# Altium schematic symbol library jlcpcb_2025_04_capacitors_extended_0402.schlib: 3594 symbols (part 17 of 20) (continued)
## JMK105BJ225MVHF
designator C?  Capacitance: 2.2uF  (hidden comment: *)
Capacitor, Ceramic (MLCC), 2.2uF, ±20%, 6.3V, X5R, ±20%, SMD 0402; Manufacturer: Taiyo Yuden; Manufacturer Part Number: JMK105BJ225MVHF; Package Size: 0402; JLCPCB Basic Part: No; JLCPCB Part Number: C386010; Supplier 1: LCSC; Category: Capacitors - MLCC; Supplier Part Number 1: C386010; Tolerance: ±20%; Voltage Rating: 6.3V; Temperature Coefficient: X5R; RoHS: Yes; ComponentLink1Description: Datasheet; ComponentLink1URL: https://wmsc.lcsc.com/wmsc/upload/file/pdf/v2/lcsc/1912111437_Taiyo-Yuden-JMK105BJ225MVHF_C386010.pdf; ComponentLink2Description: JLCPCB Part URL; ComponentLink2URL: https://jlcpcb.com/partdetail/C386010; ComponentLink3Description: LCSC Part URL; ComponentLink3URL: https://lcsc.com/product-detail/Multilayer-Ceramic-Capacitors-MLCC---SMD-SMT_Taiyo-Yuden-Taiyo-Yuden-JMK105BJ225MVHF_C386010.html
footprint CAP-0402 (0402 (1005M) Capacitor)
pins: 1, 2

## JMK105BJ474KV-F
designator C?  Capacitance: 470nF  (hidden comment: *)
Capacitor, Ceramic (MLCC), 470nF, ±10%, 6.3V, X5R, ±10%, SMD 0402; Manufacturer: Taiyo Yuden; Manufacturer Part Number: JMK105BJ474KV-F; Package Size: 0402; JLCPCB Basic Part: No; JLCPCB Part Number: C386011; Supplier 1: LCSC; Category: Capacitors - MLCC; Supplier Part Number 1: C386011; Tolerance: ±10%; Voltage Rating: 6.3V; Temperature Coefficient: X5R; RoHS: Yes; ComponentLink1Description: Datasheet; ComponentLink1URL: https://wmsc.lcsc.com/wmsc/upload/file/pdf/v2/lcsc/2211282230_Taiyo-Yuden-JMK105BJ474KV-F_C386011.pdf; ComponentLink2Description: JLCPCB Part URL; ComponentLink2URL: https://jlcpcb.com/partdetail/C386011; ComponentLink3Description: LCSC Part URL; ComponentLink3URL: https://lcsc.com/product-detail/Multilayer-Ceramic-Capacitors-MLCC---SMD-SMT_Taiyo-Yuden-Taiyo-Yuden-JMK105BJ474KV-F_C386011.html
footprint CAP-0402 (0402 (1005M) Capacitor)
pins: 1, 2

## JMK105C6105KV-F
designator C?  Capacitance: 1uF  (hidden comment: *)
Capacitor, Ceramic (MLCC), 1uF, ±10%, 6.3V, X6S, ±10%, SMD 0402; Manufacturer: Taiyo Yuden; Manufacturer Part Number: JMK105C6105KV-F; Package Size: 0402; JLCPCB Basic Part: No; JLCPCB Part Number: C386013; Supplier 1: LCSC; Category: Capacitors - MLCC; Supplier Part Number 1: C386013; Tolerance: ±10%; Voltage Rating: 6.3V; Temperature Coefficient: X6S; RoHS: Yes; ComponentLink1Description: Datasheet; ComponentLink1URL: https://wmsc.lcsc.com/wmsc/upload/file/pdf/v2/lcsc/2211282230_Taiyo-Yuden-JMK105C6105KV-F_C386013.pdf; ComponentLink2Description: JLCPCB Part URL; ComponentLink2URL: https://jlcpcb.com/partdetail/C386013; ComponentLink3Description: LCSC Part URL; ComponentLink3URL: https://lcsc.com/product-detail/Multilayer-Ceramic-Capacitors-MLCC---SMD-SMT_Taiyo-Yuden-Taiyo-Yuden-JMK105C6105KV-F_C386013.html
footprint CAP-0402 (0402 (1005M) Capacitor)
pins: 1, 2

## JMK105C6105KVLF
designator C?  Capacitance: 1uF  (hidden comment: *)
Capacitor, Ceramic (MLCC), 1uF, ±10%, 6.3V, X6S, ±10%, SMD 0402; Manufacturer: Taiyo Yuden; Manufacturer Part Number: JMK105C6105KVLF; Package Size: 0402; JLCPCB Basic Part: No; JLCPCB Part Number: C348736; Supplier 1: LCSC; Category: Capacitors - MLCC; Supplier Part Number 1: C348736; Tolerance: ±10%; Voltage Rating: 6.3V; Temperature Coefficient: X6S; RoHS: Yes; ComponentLink1Description: Datasheet; ComponentLink1URL: https://wmsc.lcsc.com/wmsc/upload/file/pdf/v2/lcsc/2304140030_Taiyo-Yuden-JMK105C6105KVLF_C348736.pdf; ComponentLink2Description: JLCPCB Part URL; ComponentLink2URL: https://jlcpcb.com/partdetail/C348736; ComponentLink3Description: LCSC Part URL; ComponentLink3URL: https://lcsc.com/product-detail/Multilayer-Ceramic-Capacitors-MLCC---SMD-SMT_Taiyo-Yuden-Taiyo-Yuden-JMK105C6105KVLF_C348736.html
footprint CAP-0402 (0402 (1005M) Capacitor)
pins: 1, 2

## JMK105C6225KV-F
designator C?  Capacitance: 2.2uF  (hidden comment: *)
Capacitor, Ceramic (MLCC), 2.2uF, ±10%, 6.3V, X6S, ±10%, SMD 0402; Manufacturer: Taiyo Yuden; Manufacturer Part Number: JMK105C6225KV-F; Package Size: 0402; JLCPCB Basic Part: No; JLCPCB Part Number: C1870803; Supplier 1: LCSC; Category: Capacitors - MLCC; Supplier Part Number 1: C1870803; Tolerance: ±10%; Voltage Rating: 6.3V; Temperature Coefficient: X6S; RoHS: Yes; ComponentLink1Description: Datasheet; ComponentLink1URL: https://wmsc.lcsc.com/wmsc/upload/file/pdf/v2/lcsc/2108160930_Taiyo-Yuden-JMK105C6225KV-F_C1870803.pdf; ComponentLink2Description: JLCPCB Part URL; ComponentLink2URL: https://jlcpcb.com/partdetail/C1870803; ComponentLink3Description: LCSC Part URL; ComponentLink3URL: https://lcsc.com/product-detail/Multilayer-Ceramic-Capacitors-MLCC---SMD-SMT_Taiyo-Yuden-Taiyo-Yuden-JMK105C6225KV-F_C1870803.html
footprint CAP-0402 (0402 (1005M) Capacitor)
pins: 1, 2

## JMK105CBJ106MV-F
designator C?  Capacitance: 10uF  (hidden comment: *)
Capacitor, Ceramic (MLCC), 10uF, ±20%, 6.3V, X5R, ±20%, SMD 0402; Manufacturer: Taiyo Yuden; Manufacturer Part Number: JMK105CBJ106MV-F; Package Size: 0402; JLCPCB Basic Part: No; JLCPCB Part Number: C87148; Supplier 1: LCSC; Category: Capacitors - MLCC; Supplier Part Number 1: C87148; Tolerance: ±20%; Voltage Rating: 6.3V; Temperature Coefficient: X5R; RoHS: Yes; ComponentLink1Description: Datasheet; ComponentLink1URL: https://wmsc.lcsc.com/wmsc/upload/file/pdf/v2/lcsc/2304140030_Taiyo-Yuden-JMK105CBJ106MV-F_C87148.pdf; ComponentLink2Description: JLCPCB Part URL; ComponentLink2URL: https://jlcpcb.com/partdetail/C87148; ComponentLink3Description: LCSC Part URL; ComponentLink3URL: https://lcsc.com/product-detail/Multilayer-Ceramic-Capacitors-MLCC---SMD-SMT_Taiyo-Yuden-Taiyo-Yuden-JMK105CBJ106MV-F_C87148.html
footprint CAP-0402 (0402 (1005M) Capacitor)
pins: 1, 2

## JMK105CD7105KVHF
designator C?  Capacitance: 1uF  (hidden comment: *)
Capacitor, Ceramic (MLCC), 1uF, ±20%, 6.3V, ±20%, SMD 0402; Manufacturer: Taiyo Yuden; Manufacturer Part Number: JMK105CD7105KVHF; Package Size: 0402; JLCPCB Basic Part: No; JLCPCB Part Number: C2766074; Supplier 1: LCSC; Category: Capacitors - MLCC; Supplier Part Number 1: C2766074; Tolerance: ±20%; Voltage Rating: 6.3V; RoHS: Yes; ComponentLink1Description: Datasheet; ComponentLink1URL: https://wmsc.lcsc.com/wmsc/upload/file/pdf/v2/lcsc/2106061634_Taiyo-Yuden-JMK105CD7105KVHF_C2766074.pdf; ComponentLink2Description: JLCPCB Part URL; ComponentLink2URL: https://jlcpcb.com/partdetail/C2766074; ComponentLink3Description: LCSC Part URL; ComponentLink3URL: https://lcsc.com/product-detail/Multilayer-Ceramic-Capacitors-MLCC---SMD-SMT_Taiyo-Yuden-Taiyo-Yuden-JMK105CD7105KVHF_C2766074.html
footprint CAP-0402 (0402 (1005M) Capacitor)
pins: 1, 2

## LDK105CBJ106MVLF
designator C?  Capacitance: 10uF  (hidden comment: *)
Capacitor, Ceramic (MLCC), 10uF, ±20%, 10V, X5R, ±20%, SMD 0402; Manufacturer: Taiyo Yuden; Manufacturer Part Number: LDK105CBJ106MVLF; Package Size: 0402; JLCPCB Basic Part: No; JLCPCB Part Number: C386033; Supplier 1: LCSC; Category: Capacitors - MLCC; Supplier Part Number 1: C386033; Tolerance: ±20%; Voltage Rating: 10V; Temperature Coefficient: X5R; RoHS: Yes; ComponentLink1Description: Datasheet; ComponentLink1URL: https://wmsc.lcsc.com/wmsc/upload/file/pdf/v2/lcsc/1912111437_Taiyo-Yuden-LDK105CBJ106MVLF_C386033.pdf; ComponentLink2Description: JLCPCB Part URL; ComponentLink2URL: https://jlcpcb.com/partdetail/C386033; ComponentLink3Description: LCSC Part URL; ComponentLink3URL: https://lcsc.com/product-detail/Multilayer-Ceramic-Capacitors-MLCC---SMD-SMT_Taiyo-Yuden-Taiyo-Yuden-LDK105CBJ106MVLF_C386033.html
footprint CAP-0402 (0402 (1005M) Capacitor)
pins: 1, 2

## LLD153D80G105ME01D
designator C?  Capacitance: 1uF  (hidden comment: *)
Capacitor, Ceramic (MLCC), 1uF, ±20%, 4V, X6T, ±20%, SMD 0402; Manufacturer: Murata Electronics; Manufacturer Part Number: LLD153D80G105ME01D; Package Size: 0402; JLCPCB Basic Part: No; JLCPCB Part Number: C435415; Supplier 1: LCSC; Category: Capacitors - MLCC; Supplier Part Number 1: C435415; Tolerance: ±20%; Voltage Rating: 4V; Temperature Coefficient: X6T; RoHS: Yes; ComponentLink1Description: Datasheet; ComponentLink1URL: https://wmsc.lcsc.com/wmsc/upload/file/pdf/v2/lcsc/2004100909_Murata-Electronics-LLD153D80G105ME01D_C435415.pdf; ComponentLink2Description: JLCPCB Part URL; ComponentLink2URL: https://jlcpcb.com/partdetail/C435415; ComponentLink3Description: LCSC Part URL; ComponentLink3URL: https://lcsc.com/product-detail/Multilayer-Ceramic-Capacitors-MLCC---SMD-SMT_Murata-Electronics-Murata-Electronics-LLD153D80G105ME01D_C435415.html
footprint CAP-0402 (0402 (1005M) Capacitor)
pins: 1, 2

## LMK105ABJ225KVHF
designator C?  Capacitance: 2.2uF  (hidden comment: *)
Capacitor, Ceramic (MLCC), 2.2uF, ±10%, 10V, X5R, ±10%, SMD 0402; Manufacturer: Taiyo Yuden; Manufacturer Part Number: LMK105ABJ225KVHF; Package Size: 0402; JLCPCB Basic Part: No; JLCPCB Part Number: C386040; Supplier 1: LCSC; Category: Capacitors - MLCC; Supplier Part Number 1: C386040; Tolerance: ±10%; Voltage Rating: 10V; Temperature Coefficient: X5R; RoHS: Yes; ComponentLink1Description: Datasheet; ComponentLink1URL: https://wmsc.lcsc.com/wmsc/upload/file/pdf/v2/lcsc/1912111437_Taiyo-Yuden-LMK105ABJ225KVHF_C386040.pdf; ComponentLink2Description: JLCPCB Part URL; ComponentLink2URL: https://jlcpcb.com/partdetail/C386040; ComponentLink3Description: LCSC Part URL; ComponentLink3URL: https://lcsc.com/product-detail/Multilayer-Ceramic-Capacitors-MLCC---SMD-SMT_Taiyo-Yuden-Taiyo-Yuden-LMK105ABJ225KVHF_C386040.html
footprint CAP-0402 (0402 (1005M) Capacitor)
pins: 1, 2

## LMK105ABJ225MVHF
designator C?  Capacitance: 2.2uF  (hidden comment: *)
Capacitor, Ceramic (MLCC), 2.2uF, ±20%, 10V, X5R, ±20%, SMD 0402; Manufacturer: Taiyo Yuden; Manufacturer Part Number: LMK105ABJ225MVHF; Package Size: 0402; JLCPCB Basic Part: No; JLCPCB Part Number: C386041; Supplier 1: LCSC; Category: Capacitors - MLCC; Supplier Part Number 1: C386041; Tolerance: ±20%; Voltage Rating: 10V; Temperature Coefficient: X5R; RoHS: Yes; ComponentLink1Description: Datasheet; ComponentLink1URL: https://wmsc.lcsc.com/wmsc/upload/file/pdf/v2/lcsc/2211282230_Taiyo-Yuden-LMK105ABJ225MVHF_C386041.pdf; ComponentLink2Description: JLCPCB Part URL; ComponentLink2URL: https://jlcpcb.com/partdetail/C386041; ComponentLink3Description: LCSC Part URL; ComponentLink3URL: https://lcsc.com/product-detail/Multilayer-Ceramic-Capacitors-MLCC---SMD-SMT_Taiyo-Yuden-Taiyo-Yuden-LMK105ABJ225MVHF_C386041.html
footprint CAP-0402 (0402 (1005M) Capacitor)
pins: 1, 2

## LMK105B7224KVHF
designator C?  Capacitance: 220nF  (hidden comment: *)
Capacitor, Ceramic (MLCC), 220nF, ±10%, 10V, X7R, ±10%, SMD 0402; Manufacturer: Taiyo Yuden; Manufacturer Part Number: LMK105B7224KVHF; Package Size: 0402; JLCPCB Basic Part: No; JLCPCB Part Number: C386042; Supplier 1: LCSC; Category: Capacitors - MLCC; Supplier Part Number 1: C386042; Tolerance: ±10%; Voltage Rating: 10V; Temperature Coefficient: X7R; RoHS: Yes; ComponentLink1Description: Datasheet; ComponentLink1URL: https://wmsc.lcsc.com/wmsc/upload/file/pdf/v2/lcsc/2211282230_Taiyo-Yuden-LMK105B7224KVHF_C386042.pdf; ComponentLink2Description: JLCPCB Part URL; ComponentLink2URL: https://jlcpcb.com/partdetail/C386042; ComponentLink3Description: LCSC Part URL; ComponentLink3URL: https://lcsc.com/product-detail/Multilayer-Ceramic-Capacitors-MLCC---SMD-SMT_Taiyo-Yuden-Taiyo-Yuden-LMK105B7224KVHF_C386042.html
footprint CAP-0402 (0402 (1005M) Capacitor)
pins: 1, 2

## LMK105BBJ475KV-F
designator C?  Capacitance: 4.7uF  (hidden comment: *)
Capacitor, Ceramic (MLCC), 4.7uF, ±10%, 10V, X5R, ±10%, SMD 0402; Manufacturer: Taiyo Yuden; Manufacturer Part Number: LMK105BBJ475KV-F; Package Size: 0402; JLCPCB Basic Part: No; JLCPCB Part Number: C2986065; Supplier 1: LCSC; Category: Capacitors - MLCC; Supplier Part Number 1: C2986065; Tolerance: ±10%; Voltage Rating: 10V; Temperature Coefficient: X5R; RoHS: Yes; ComponentLink1Description: Datasheet; ComponentLink1URL: https://wmsc.lcsc.com/wmsc/upload/file/pdf/v2/lcsc/2203281730_Taiyo-Yuden-LMK105BBJ475KV-F_C2986065.pdf; ComponentLink2Description: JLCPCB Part URL; ComponentLink2URL: https://jlcpcb.com/partdetail/C2986065; ComponentLink3Description: LCSC Part URL; ComponentLink3URL: https://lcsc.com/product-detail/Multilayer-Ceramic-Capacitors-MLCC---SMD-SMT_Taiyo-Yuden-Taiyo-Yuden-LMK105BBJ475KV-F_C2986065.html
footprint CAP-0402 (0402 (1005M) Capacitor)
pins: 1, 2

## LMK105BBJ475MVLF
designator C?  Capacitance: 4.7uF  (hidden comment: *)
Capacitor, Ceramic (MLCC), 4.7uF, ±20%, 10V, X5R, ±20%, SMD 0402; Manufacturer: Taiyo Yuden; Manufacturer Part Number: LMK105BBJ475MVLF; Package Size: 0402; JLCPCB Basic Part: No; JLCPCB Part Number: C386043; Supplier 1: LCSC; Category: Capacitors - MLCC; Supplier Part Number 1: C386043; Tolerance: ±20%; Voltage Rating: 10V; Temperature Coefficient: X5R; RoHS: Yes; ComponentLink1Description: Datasheet; ComponentLink1URL: https://wmsc.lcsc.com/wmsc/upload/file/pdf/v2/lcsc/2211282230_Taiyo-Yuden-LMK105BBJ475MVLF_C386043.pdf; ComponentLink2Description: JLCPCB Part URL; ComponentLink2URL: https://jlcpcb.com/partdetail/C386043; ComponentLink3Description: LCSC Part URL; ComponentLink3URL: https://lcsc.com/product-detail/Multilayer-Ceramic-Capacitors-MLCC---SMD-SMT_Taiyo-Yuden-Taiyo-Yuden-LMK105BBJ475MVLF_C386043.html
footprint CAP-0402 (0402 (1005M) Capacitor)
pins: 1, 2

## LMK105BJ104KVHF
designator C?  Capacitance: 100nF  (hidden comment: *)
Capacitor, Ceramic (MLCC), 100nF, ±10%, 10V, X5R, ±10%, SMD 0402; Manufacturer: Taiyo Yuden; Manufacturer Part Number: LMK105BJ104KVHF; Package Size: 0402; JLCPCB Basic Part: No; JLCPCB Part Number: C386044; Supplier 1: LCSC; Category: Capacitors - MLCC; Supplier Part Number 1: C386044; Tolerance: ±10%; Voltage Rating: 10V; Temperature Coefficient: X5R; RoHS: Yes; ComponentLink1Description: Datasheet; ComponentLink1URL: https://wmsc.lcsc.com/wmsc/upload/file/pdf/v2/lcsc/1912111437_Taiyo-Yuden-LMK105BJ104KVHF_C386044.pdf; ComponentLink2Description: JLCPCB Part URL; ComponentLink2URL: https://jlcpcb.com/partdetail/C386044; ComponentLink3Description: LCSC Part URL; ComponentLink3URL: https://lcsc.com/product-detail/Multilayer-Ceramic-Capacitors-MLCC---SMD-SMT_Taiyo-Yuden-Taiyo-Yuden-LMK105BJ104KVHF_C386044.html
footprint CAP-0402 (0402 (1005M) Capacitor)
pins: 1, 2

## LMK105BJ105KV-F
designator C?  Capacitance: 1uF  (hidden comment: *)
Capacitor, Ceramic (MLCC), 1uF, ±10%, 10V, X5R, ±10%, SMD 0402; Manufacturer: Taiyo Yuden; Manufacturer Part Number: LMK105BJ105KV-F; Package Size: 0402; JLCPCB Basic Part: No; JLCPCB Part Number: C87145; Supplier 1: LCSC; Category: Capacitors - MLCC; Supplier Part Number 1: C87145; Tolerance: ±10%; Voltage Rating: 10V; Temperature Coefficient: X5R; RoHS: Yes; ComponentLink1Description: Datasheet; ComponentLink1URL: https://wmsc.lcsc.com/wmsc/upload/file/pdf/v2/lcsc/2304140030_Taiyo-Yuden-LMK105BJ105KV-F_C87145.pdf; ComponentLink2Description: JLCPCB Part URL; ComponentLink2URL: https://jlcpcb.com/partdetail/C87145; ComponentLink3Description: LCSC Part URL; ComponentLink3URL: https://lcsc.com/product-detail/Multilayer-Ceramic-Capacitors-MLCC---SMD-SMT_Taiyo-Yuden-Taiyo-Yuden-LMK105BJ105KV-F_C87145.html
footprint CAP-0402 (0402 (1005M) Capacitor)
pins: 1, 2

## LMK105BJ105KVBF
designator C?  Capacitance: 1uF  (hidden comment: *)
Capacitor, Ceramic (MLCC), 1uF, ±10%, 10V, X5R, ±10%, SMD 0402; Manufacturer: Taiyo Yuden; Manufacturer Part Number: LMK105BJ105KVBF; Package Size: 0402; JLCPCB Basic Part: No; JLCPCB Part Number: C337448; Supplier 1: LCSC; Category: Capacitors - MLCC; Supplier Part Number 1: C337448; Tolerance: ±10%; Voltage Rating: 10V; Temperature Coefficient: X5R; RoHS: Yes; ComponentLink1Description: Datasheet; ComponentLink1URL: https://wmsc.lcsc.com/wmsc/upload/file/pdf/v2/lcsc/2304140030_Taiyo-Yuden-LMK105BJ105KVBF_C337448.pdf; ComponentLink2Description: JLCPCB Part URL; ComponentLink2URL: https://jlcpcb.com/partdetail/C337448; ComponentLink3Description: LCSC Part URL; ComponentLink3URL: https://lcsc.com/product-detail/Multilayer-Ceramic-Capacitors-MLCC---SMD-SMT_Taiyo-Yuden-Taiyo-Yuden-LMK105BJ105KVBF_C337448.html
footprint CAP-0402 (0402 (1005M) Capacitor)
pins: 1, 2

## LMK105BJ105KVHF
designator C?  Capacitance: 1uF  (hidden comment: *)
Capacitor, Ceramic (MLCC), 1uF, ±10%, 10V, X5R, ±10%, SMD 0402; Manufacturer: Taiyo Yuden; Manufacturer Part Number: LMK105BJ105KVHF; Package Size: 0402; JLCPCB Basic Part: No; JLCPCB Part Number: C412453; Supplier 1: LCSC; Category: Capacitors - MLCC; Supplier Part Number 1: C412453; Tolerance: ±10%; Voltage Rating: 10V; Temperature Coefficient: X5R; RoHS: Yes; ComponentLink1Description: Datasheet; ComponentLink1URL: https://wmsc.lcsc.com/wmsc/upload/file/pdf/v2/lcsc/2304140030_Taiyo-Yuden-LMK105BJ105KVHF_C412453.pdf; ComponentLink2Description: JLCPCB Part URL; ComponentLink2URL: https://jlcpcb.com/partdetail/C412453; ComponentLink3Description: LCSC Part URL; ComponentLink3URL: https://lcsc.com/product-detail/Multilayer-Ceramic-Capacitors-MLCC---SMD-SMT_Taiyo-Yuden-Taiyo-Yuden-LMK105BJ105KVHF_C412453.html
footprint CAP-0402 (0402 (1005M) Capacitor)
pins: 1, 2

## LMK105BJ224KV-F
designator C?  Capacitance: 220nF  (hidden comment: *)
Capacitor, Ceramic (MLCC), 220nF, ±10%, 10V, X5R, ±10%, SMD 0402; Manufacturer: Taiyo Yuden; Manufacturer Part Number: LMK105BJ224KV-F; Package Size: 0402; JLCPCB Basic Part: No; JLCPCB Part Number: C89141; Supplier 1: LCSC; Category: Capacitors - MLCC; Supplier Part Number 1: C89141; Tolerance: ±10%; Voltage Rating: 10V; Temperature Coefficient: X5R; RoHS: Yes; ComponentLink1Description: Datasheet; ComponentLink1URL: https://wmsc.lcsc.com/wmsc/upload/file/pdf/v2/lcsc/2304140030_Taiyo-Yuden-LMK105BJ224KV-F_C89141.pdf; ComponentLink2Description: JLCPCB Part URL; ComponentLink2URL: https://jlcpcb.com/partdetail/C89141; ComponentLink3Description: LCSC Part URL; ComponentLink3URL: https://lcsc.com/product-detail/Multilayer-Ceramic-Capacitors-MLCC---SMD-SMT_Taiyo-Yuden-Taiyo-Yuden-LMK105BJ224KV-F_C89141.html
footprint CAP-0402 (0402 (1005M) Capacitor)
pins: 1, 2

## LMK105BJ225KV-F
designator C?  Capacitance: 2.2uF  (hidden comment: *)
Capacitor, Ceramic (MLCC), 2.2uF, ±10%, 10V, X5R, ±10%, SMD 0402; Manufacturer: Taiyo Yuden; Manufacturer Part Number: LMK105BJ225KV-F; Package Size: 0402; JLCPCB Basic Part: No; JLCPCB Part Number: C319191; Supplier 1: LCSC; Category: Capacitors - MLCC; Supplier Part Number 1: C319191; Tolerance: ±10%; Voltage Rating: 10V; Temperature Coefficient: X5R; RoHS: Yes; ComponentLink1Description: Datasheet; ComponentLink1URL: https://wmsc.lcsc.com/wmsc/upload/file/pdf/v2/lcsc/2304140030_Taiyo-Yuden-LMK105BJ225KV-F_C319191.pdf; ComponentLink2Description: JLCPCB Part URL; ComponentLink2URL: https://jlcpcb.com/partdetail/C319191; ComponentLink3Description: LCSC Part URL; ComponentLink3URL: https://lcsc.com/product-detail/Multilayer-Ceramic-Capacitors-MLCC---SMD-SMT_Taiyo-Yuden-Taiyo-Yuden-LMK105BJ225KV-F_C319191.html
footprint CAP-0402 (0402 (1005M) Capacitor)
pins: 1, 2

## LMK105BJ225MV-F
designator C?  Capacitance: 2.2uF  (hidden comment: *)
Capacitor, Ceramic (MLCC), 2.2uF, ±20%, 10V, X5R, ±20%, SMD 0402; Manufacturer: Taiyo Yuden; Manufacturer Part Number: LMK105BJ225MV-F; Package Size: 0402; JLCPCB Basic Part: No; JLCPCB Part Number: C92805; Supplier 1: LCSC; Category: Capacitors - MLCC; Supplier Part Number 1: C92805; Tolerance: ±20%; Voltage Rating: 10V; Temperature Coefficient: X5R; RoHS: Yes; ComponentLink1Description: Datasheet; ComponentLink1URL: https://wmsc.lcsc.com/wmsc/upload/file/pdf/v2/lcsc/2211282300_Taiyo-Yuden-LMK105BJ225MV-F_C92805.pdf; ComponentLink2Description: JLCPCB Part URL; ComponentLink2URL: https://jlcpcb.com/partdetail/C92805; ComponentLink3Description: LCSC Part URL; ComponentLink3URL: https://lcsc.com/product-detail/Multilayer-Ceramic-Capacitors-MLCC---SMD-SMT_Taiyo-Yuden-Taiyo-Yuden-LMK105BJ225MV-F_C92805.html
footprint CAP-0402 (0402 (1005M) Capacitor)
pins: 1, 2

## LMK105BJ473KV-F
designator C?  Capacitance: 47nF  (hidden comment: *)
Capacitor, Ceramic (MLCC), 47nF, ±10%, 10V, X5R, ±10%, SMD 0402; Manufacturer: Taiyo Yuden; Manufacturer Part Number: LMK105BJ473KV-F; Package Size: 0402; JLCPCB Basic Part: No; JLCPCB Part Number: C386045; Supplier 1: LCSC; Category: Capacitors - MLCC; Supplier Part Number 1: C386045; Tolerance: ±10%; Voltage Rating: 10V; Temperature Coefficient: X5R; RoHS: Yes; ComponentLink1Description: Datasheet; ComponentLink1URL: https://wmsc.lcsc.com/wmsc/upload/file/pdf/v2/lcsc/2304140030_Taiyo-Yuden-LMK105BJ473KV-F_C386045.pdf; ComponentLink2Description: JLCPCB Part URL; ComponentLink2URL: https://jlcpcb.com/partdetail/C386045; ComponentLink3Description: LCSC Part URL; ComponentLink3URL: https://lcsc.com/product-detail/Multilayer-Ceramic-Capacitors-MLCC---SMD-SMT_Taiyo-Yuden-Taiyo-Yuden-LMK105BJ473KV-F_C386045.html
footprint CAP-0402 (0402 (1005M) Capacitor)
pins: 1, 2

## LMK105BJ474KV-F
designator C?  Capacitance: 470nF  (hidden comment: *)
Capacitor, Ceramic (MLCC), 470nF, ±10%, 10V, X5R, ±10%, SMD 0402; Manufacturer: Taiyo Yuden; Manufacturer Part Number: LMK105BJ474KV-F; Package Size: 0402; JLCPCB Basic Part: No; JLCPCB Part Number: C89142; Supplier 1: LCSC; Category: Capacitors - MLCC; Supplier Part Number 1: C89142; Tolerance: ±10%; Voltage Rating: 10V; Temperature Coefficient: X5R; RoHS: Yes; ComponentLink1Description: Datasheet; ComponentLink1URL: https://wmsc.lcsc.com/wmsc/upload/file/pdf/v2/lcsc/2211282300_Taiyo-Yuden-LMK105BJ474KV-F_C89142.pdf; ComponentLink2Description: JLCPCB Part URL; ComponentLink2URL: https://jlcpcb.com/partdetail/C89142; ComponentLink3Description: LCSC Part URL; ComponentLink3URL: https://lcsc.com/product-detail/Multilayer-Ceramic-Capacitors-MLCC---SMD-SMT_Taiyo-Yuden-Taiyo-Yuden-LMK105BJ474KV-F_C89142.html
footprint CAP-0402 (0402 (1005M) Capacitor)
pins: 1, 2

## LMK105C6105KV-F
designator C?  Capacitance: 1uF  (hidden comment: *)
Capacitor, Ceramic (MLCC), 1uF, ±10%, 10V, X6S, ±10%, SMD 0402; Manufacturer: Taiyo Yuden; Manufacturer Part Number: LMK105C6105KV-F; Package Size: 0402; JLCPCB Basic Part: No; JLCPCB Part Number: C386046; Supplier 1: LCSC; Category: Capacitors - MLCC; Supplier Part Number 1: C386046; Tolerance: ±10%; Voltage Rating: 10V; Temperature Coefficient: X6S; RoHS: Yes; ComponentLink1Description: Datasheet; ComponentLink1URL: https://wmsc.lcsc.com/wmsc/upload/file/pdf/v2/lcsc/2211282230_Taiyo-Yuden-LMK105C6105KV-F_C386046.pdf; ComponentLink2Description: JLCPCB Part URL; ComponentLink2URL: https://jlcpcb.com/partdetail/C386046; ComponentLink3Description: LCSC Part URL; ComponentLink3URL: https://lcsc.com/product-detail/Multilayer-Ceramic-Capacitors-MLCC---SMD-SMT_Taiyo-Yuden-Taiyo-Yuden-LMK105C6105KV-F_C386046.html
footprint CAP-0402 (0402 (1005M) Capacitor)
pins: 1, 2

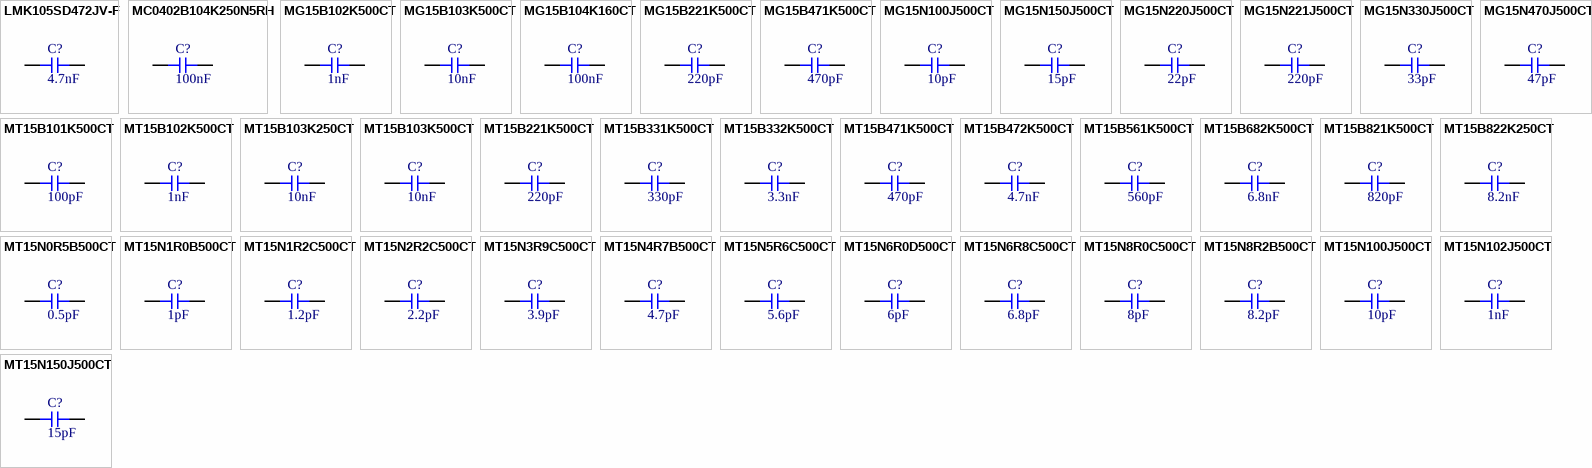
[diagram p78: symbols LMK105SD472JV-F to MT15N150J500CT]

## LMK105SD472JV-F
designator C?  Capacitance: 4.7nF  (hidden comment: *)
Capacitor, Ceramic (MLCC), 4.7nF, ±5%, 10V, ±5%, SMD 0402; Manufacturer: Taiyo Yuden; Manufacturer Part Number: LMK105SD472JV-F; Package Size: 0402; JLCPCB Basic Part: No; JLCPCB Part Number: C524944; Supplier 1: LCSC; Category: Capacitors - MLCC; Supplier Part Number 1: C524944; Tolerance: ±5%; Voltage Rating: 10V; RoHS: Yes; ComponentLink1Description: Datasheet; ComponentLink1URL: https://wmsc.lcsc.com/wmsc/upload/file/pdf/v2/lcsc/2211282200_Taiyo-Yuden-LMK105SD472JV-F_C524944.pdf; ComponentLink2Description: JLCPCB Part URL; ComponentLink2URL: https://jlcpcb.com/partdetail/C524944; ComponentLink3Description: LCSC Part URL; ComponentLink3URL: https://lcsc.com/product-detail/Multilayer-Ceramic-Capacitors-MLCC---SMD-SMT_Taiyo-Yuden-Taiyo-Yuden-LMK105SD472JV-F_C524944.html
footprint CAP-0402 (0402 (1005M) Capacitor)
pins: 1, 2

## MC0402B104K250N5RH
designator C?  Capacitance: 100nF  (hidden comment: *)
Capacitor, Ceramic (MLCC), 100nF, 25V, SMD 0402; Manufacturer: Sunway; Manufacturer Part Number: MC0402B104K250N5RH; Package Size: 0402; JLCPCB Basic Part: No; JLCPCB Part Number: C3152534; Supplier 1: LCSC; Category: Capacitors - MLCC; Supplier Part Number 1: C3152534; Voltage Rating: 25V; RoHS: Yes; ComponentLink1Description: Datasheet; ComponentLink1URL: https://datasheet.lcsc.com/lcsc/2207271730_Sunway-MC0402B104K250N5RH_C3152534.pdf; ComponentLink2Description: JLCPCB Part URL; ComponentLink2URL: https://jlcpcb.com/partdetail/C3152534; ComponentLink3Description: LCSC Part URL; ComponentLink3URL: https://lcsc.com/product-detail/Multilayer-Ceramic-Capacitors-MLCC---SMD-SMT_Sunway-Sunway-MC0402B104K250N5RH_C3152534.html
footprint CAP-0402 (0402 (1005M) Capacitor)
pins: 1, 2

## MG15B102K500CT
designator C?  Capacitance: 1nF  (hidden comment: *)
Capacitor, Ceramic (MLCC), 1nF, ±10%, 50V, X7R, ±10%, SMD 0402; Manufacturer: Walsin Tech Corp; Manufacturer Part Number: MG15B102K500CT; Package Size: 0402; JLCPCB Basic Part: No; JLCPCB Part Number: C327779; Supplier 1: LCSC; Category: Capacitors - MLCC; Supplier Part Number 1: C327779; Tolerance: ±10%; Voltage Rating: 50V; Temperature Coefficient: X7R; RoHS: Yes; ComponentLink1Description: Datasheet; ComponentLink1URL: https://wmsc.lcsc.com/wmsc/upload/file/pdf/v2/lcsc/2304140030_Walsin-Tech-Corp-MG15B102K500CT_C327779.pdf; ComponentLink2Description: JLCPCB Part URL; ComponentLink2URL: https://jlcpcb.com/partdetail/C327779; ComponentLink3Description: LCSC Part URL; ComponentLink3URL: https://lcsc.com/product-detail/Multilayer-Ceramic-Capacitors-MLCC---SMD-SMT_Walsin-Tech-Corp-Walsin-Tech-Corp-MG15B102K500CT_C327779.html
footprint CAP-0402 (0402 (1005M) Capacitor)
pins: 1, 2

## MG15B103K500CT
designator C?  Capacitance: 10nF  (hidden comment: *)
Capacitor, Ceramic (MLCC), 10nF, ±10%, 50V, X7R, ±10%, SMD 0402; Manufacturer: Walsin Tech Corp; Manufacturer Part Number: MG15B103K500CT; Package Size: 0402; JLCPCB Basic Part: No; JLCPCB Part Number: C327780; Supplier 1: LCSC; Category: Capacitors - MLCC; Supplier Part Number 1: C327780; Tolerance: ±10%; Voltage Rating: 50V; Temperature Coefficient: X7R; RoHS: Yes; ComponentLink1Description: Datasheet; ComponentLink1URL: https://wmsc.lcsc.com/wmsc/upload/file/pdf/v2/lcsc/2304140030_Walsin-Tech-Corp-MG15B103K500CT_C327780.pdf; ComponentLink2Description: JLCPCB Part URL; ComponentLink2URL: https://jlcpcb.com/partdetail/C327780; ComponentLink3Description: LCSC Part URL; ComponentLink3URL: https://lcsc.com/product-detail/Multilayer-Ceramic-Capacitors-MLCC---SMD-SMT_Walsin-Tech-Corp-Walsin-Tech-Corp-MG15B103K500CT_C327780.html
footprint CAP-0402 (0402 (1005M) Capacitor)
pins: 1, 2

## MG15B104K160CT
designator C?  Capacitance: 100nF  (hidden comment: *)
Capacitor, Ceramic (MLCC), 100nF, ±10%, 16V, X7R, ±10%, SMD 0402; Manufacturer: Walsin Tech Corp; Manufacturer Part Number: MG15B104K160CT; Package Size: 0402; JLCPCB Basic Part: No; JLCPCB Part Number: C327781; Supplier 1: LCSC; Category: Capacitors - MLCC; Supplier Part Number 1: C327781; Tolerance: ±10%; Voltage Rating: 16V; Temperature Coefficient: X7R; RoHS: Yes; ComponentLink1Description: Datasheet; ComponentLink1URL: https://wmsc.lcsc.com/wmsc/upload/file/pdf/v2/lcsc/2304140030_Walsin-Tech-Corp-MG15B104K160CT_C327781.pdf; ComponentLink2Description: JLCPCB Part URL; ComponentLink2URL: https://jlcpcb.com/partdetail/C327781; ComponentLink3Description: LCSC Part URL; ComponentLink3URL: https://lcsc.com/product-detail/Multilayer-Ceramic-Capacitors-MLCC---SMD-SMT_Walsin-Tech-Corp-Walsin-Tech-Corp-MG15B104K160CT_C327781.html
footprint CAP-0402 (0402 (1005M) Capacitor)
pins: 1, 2

## MG15B221K500CT
designator C?  Capacitance: 220pF  (hidden comment: *)
Capacitor, Ceramic (MLCC), 220pF, ±10%, 50V, X7R, ±10%, SMD 0402; Manufacturer: Walsin Tech Corp; Manufacturer Part Number: MG15B221K500CT; Package Size: 0402; JLCPCB Basic Part: No; JLCPCB Part Number: C327782; Supplier 1: LCSC; Category: Capacitors - MLCC; Supplier Part Number 1: C327782; Tolerance: ±10%; Voltage Rating: 50V; Temperature Coefficient: X7R; RoHS: Yes; ComponentLink1Description: Datasheet; ComponentLink1URL: https://wmsc.lcsc.com/wmsc/upload/file/pdf/v2/lcsc/2304140030_Walsin-Tech-Corp-MG15B221K500CT_C327782.pdf; ComponentLink2Description: JLCPCB Part URL; ComponentLink2URL: https://jlcpcb.com/partdetail/C327782; ComponentLink3Description: LCSC Part URL; ComponentLink3URL: https://lcsc.com/product-detail/Multilayer-Ceramic-Capacitors-MLCC---SMD-SMT_Walsin-Tech-Corp-Walsin-Tech-Corp-MG15B221K500CT_C327782.html
footprint CAP-0402 (0402 (1005M) Capacitor)
pins: 1, 2

## MG15B471K500CT
designator C?  Capacitance: 470pF  (hidden comment: *)
Capacitor, Ceramic (MLCC), 470pF, ±10%, 50V, X7R, ±10%, SMD 0402; Manufacturer: Walsin Tech Corp; Manufacturer Part Number: MG15B471K500CT; Package Size: 0402; JLCPCB Basic Part: No; JLCPCB Part Number: C327783; Supplier 1: LCSC; Category: Capacitors - MLCC; Supplier Part Number 1: C327783; Tolerance: ±10%; Voltage Rating: 50V; Temperature Coefficient: X7R; RoHS: Yes; ComponentLink1Description: Datasheet; ComponentLink1URL: https://wmsc.lcsc.com/wmsc/upload/file/pdf/v2/lcsc/2304140030_Walsin-Tech-Corp-MG15B471K500CT_C327783.pdf; ComponentLink2Description: JLCPCB Part URL; ComponentLink2URL: https://jlcpcb.com/partdetail/C327783; ComponentLink3Description: LCSC Part URL; ComponentLink3URL: https://lcsc.com/product-detail/Multilayer-Ceramic-Capacitors-MLCC---SMD-SMT_Walsin-Tech-Corp-Walsin-Tech-Corp-MG15B471K500CT_C327783.html
footprint CAP-0402 (0402 (1005M) Capacitor)
pins: 1, 2

## MG15N100J500CT
designator C?  Capacitance: 10pF  (hidden comment: *)
Capacitor, Ceramic (MLCC), 10pF, ±5%, 50V, NP0, ±5%, SMD 0402; Manufacturer: Walsin Tech Corp; Manufacturer Part Number: MG15N100J500CT; Package Size: 0402; JLCPCB Basic Part: No; JLCPCB Part Number: C327784; Supplier 1: LCSC; Category: Capacitors - MLCC; Supplier Part Number 1: C327784; Tolerance: ±5%; Voltage Rating: 50V; Temperature Coefficient: NP0; RoHS: Yes; ComponentLink1Description: Datasheet; ComponentLink1URL: https://wmsc.lcsc.com/wmsc/upload/file/pdf/v2/lcsc/2304140030_Walsin-Tech-Corp-MG15N100J500CT_C327784.pdf; ComponentLink2Description: JLCPCB Part URL; ComponentLink2URL: https://jlcpcb.com/partdetail/C327784; ComponentLink3Description: LCSC Part URL; ComponentLink3URL: https://lcsc.com/product-detail/Multilayer-Ceramic-Capacitors-MLCC---SMD-SMT_Walsin-Tech-Corp-Walsin-Tech-Corp-MG15N100J500CT_C327784.html
footprint CAP-0402 (0402 (1005M) Capacitor)
pins: 1, 2

## MG15N150J500CT
designator C?  Capacitance: 15pF  (hidden comment: *)
Capacitor, Ceramic (MLCC), 15pF, ±5%, 50V, NP0, ±5%, SMD 0402; Manufacturer: Walsin Tech Corp; Manufacturer Part Number: MG15N150J500CT; Package Size: 0402; JLCPCB Basic Part: No; JLCPCB Part Number: C327787; Supplier 1: LCSC; Category: Capacitors - MLCC; Supplier Part Number 1: C327787; Tolerance: ±5%; Voltage Rating: 50V; Temperature Coefficient: NP0; RoHS: Yes; ComponentLink1Description: Datasheet; ComponentLink1URL: https://wmsc.lcsc.com/wmsc/upload/file/pdf/v2/lcsc/2304140030_Walsin-Tech-Corp-MG15N150J500CT_C327787.pdf; ComponentLink2Description: JLCPCB Part URL; ComponentLink2URL: https://jlcpcb.com/partdetail/C327787; ComponentLink3Description: LCSC Part URL; ComponentLink3URL: https://lcsc.com/product-detail/Multilayer-Ceramic-Capacitors-MLCC---SMD-SMT_Walsin-Tech-Corp-Walsin-Tech-Corp-MG15N150J500CT_C327787.html
footprint CAP-0402 (0402 (1005M) Capacitor)
pins: 1, 2

## MG15N220J500CT
designator C?  Capacitance: 22pF  (hidden comment: *)
Capacitor, Ceramic (MLCC), 22pF, ±5%, 50V, NP0, ±5%, SMD 0402; Manufacturer: Walsin Tech Corp; Manufacturer Part Number: MG15N220J500CT; Package Size: 0402; JLCPCB Basic Part: No; JLCPCB Part Number: C327788; Supplier 1: LCSC; Category: Capacitors - MLCC; Supplier Part Number 1: C327788; Tolerance: ±5%; Voltage Rating: 50V; Temperature Coefficient: NP0; RoHS: Yes; ComponentLink1Description: Datasheet; ComponentLink1URL: https://wmsc.lcsc.com/wmsc/upload/file/pdf/v2/lcsc/2304140030_Walsin-Tech-Corp-MG15N220J500CT_C327788.pdf; ComponentLink2Description: JLCPCB Part URL; ComponentLink2URL: https://jlcpcb.com/partdetail/C327788; ComponentLink3Description: LCSC Part URL; ComponentLink3URL: https://lcsc.com/product-detail/Multilayer-Ceramic-Capacitors-MLCC---SMD-SMT_Walsin-Tech-Corp-Walsin-Tech-Corp-MG15N220J500CT_C327788.html
footprint CAP-0402 (0402 (1005M) Capacitor)
pins: 1, 2

## MG15N221J500CT
designator C?  Capacitance: 220pF  (hidden comment: *)
Capacitor, Ceramic (MLCC), 220pF, ±5%, 50V, NP0, ±5%, SMD 0402; Manufacturer: Walsin Tech Corp; Manufacturer Part Number: MG15N221J500CT; Package Size: 0402; JLCPCB Basic Part: No; JLCPCB Part Number: C327789; Supplier 1: LCSC; Category: Capacitors - MLCC; Supplier Part Number 1: C327789; Tolerance: ±5%; Voltage Rating: 50V; Temperature Coefficient: NP0; RoHS: Yes; ComponentLink1Description: Datasheet; ComponentLink1URL: https://wmsc.lcsc.com/wmsc/upload/file/pdf/v2/lcsc/2304140030_Walsin-Tech-Corp-MG15N221J500CT_C327789.pdf; ComponentLink2Description: JLCPCB Part URL; ComponentLink2URL: https://jlcpcb.com/partdetail/C327789; ComponentLink3Description: LCSC Part URL; ComponentLink3URL: https://lcsc.com/product-detail/Multilayer-Ceramic-Capacitors-MLCC---SMD-SMT_Walsin-Tech-Corp-Walsin-Tech-Corp-MG15N221J500CT_C327789.html
footprint CAP-0402 (0402 (1005M) Capacitor)
pins: 1, 2

## MG15N330J500CT
designator C?  Capacitance: 33pF  (hidden comment: *)
Capacitor, Ceramic (MLCC), 33pF, ±5%, 50V, NP0, ±5%, SMD 0402; Manufacturer: Walsin Tech Corp; Manufacturer Part Number: MG15N330J500CT; Package Size: 0402; JLCPCB Basic Part: No; JLCPCB Part Number: C327790; Supplier 1: LCSC; Category: Capacitors - MLCC; Supplier Part Number 1: C327790; Tolerance: ±5%; Voltage Rating: 50V; Temperature Coefficient: NP0; RoHS: Yes; ComponentLink1Description: Datasheet; ComponentLink1URL: https://wmsc.lcsc.com/wmsc/upload/file/pdf/v2/lcsc/2304140030_Walsin-Tech-Corp-MG15N330J500CT_C327790.pdf; ComponentLink2Description: JLCPCB Part URL; ComponentLink2URL: https://jlcpcb.com/partdetail/C327790; ComponentLink3Description: LCSC Part URL; ComponentLink3URL: https://lcsc.com/product-detail/Multilayer-Ceramic-Capacitors-MLCC---SMD-SMT_Walsin-Tech-Corp-Walsin-Tech-Corp-MG15N330J500CT_C327790.html
footprint CAP-0402 (0402 (1005M) Capacitor)
pins: 1, 2

## MG15N470J500CT
designator C?  Capacitance: 47pF  (hidden comment: *)
Capacitor, Ceramic (MLCC), 47pF, ±5%, 50V, NP0, ±5%, SMD 0402; Manufacturer: Walsin Tech Corp; Manufacturer Part Number: MG15N470J500CT; Package Size: 0402; JLCPCB Basic Part: No; JLCPCB Part Number: C327791; Supplier 1: LCSC; Category: Capacitors - MLCC; Supplier Part Number 1: C327791; Tolerance: ±5%; Voltage Rating: 50V; Temperature Coefficient: NP0; RoHS: Yes; ComponentLink1Description: Datasheet; ComponentLink1URL: https://wmsc.lcsc.com/wmsc/upload/file/pdf/v2/lcsc/2304140030_Walsin-Tech-Corp-MG15N470J500CT_C327791.pdf; ComponentLink2Description: JLCPCB Part URL; ComponentLink2URL: https://jlcpcb.com/partdetail/C327791; ComponentLink3Description: LCSC Part URL; ComponentLink3URL: https://lcsc.com/product-detail/Multilayer-Ceramic-Capacitors-MLCC---SMD-SMT_Walsin-Tech-Corp-Walsin-Tech-Corp-MG15N470J500CT_C327791.html
footprint CAP-0402 (0402 (1005M) Capacitor)
pins: 1, 2

## MT15B101K500CT
designator C?  Capacitance: 100pF  (hidden comment: *)
Capacitor, Ceramic (MLCC), 100pF, ±10%, 50V, X7R, ±10%, SMD 0402; Manufacturer: Walsin Tech Corp; Manufacturer Part Number: MT15B101K500CT; Package Size: 0402; JLCPCB Basic Part: No; JLCPCB Part Number: C458946; Supplier 1: LCSC; Category: Capacitors - MLCC; Supplier Part Number 1: C458946; Tolerance: ±10%; Voltage Rating: 50V; Temperature Coefficient: X7R; RoHS: Yes; ComponentLink1Description: Datasheet; ComponentLink1URL: https://wmsc.lcsc.com/wmsc/upload/file/pdf/v2/lcsc/2304140030_Walsin-Tech-Corp-MT15B101K500CT_C458946.pdf; ComponentLink2Description: JLCPCB Part URL; ComponentLink2URL: https://jlcpcb.com/partdetail/C458946; ComponentLink3Description: LCSC Part URL; ComponentLink3URL: https://lcsc.com/product-detail/Multilayer-Ceramic-Capacitors-MLCC---SMD-SMT_Walsin-Tech-Corp-Walsin-Tech-Corp-MT15B101K500CT_C458946.html
footprint CAP-0402 (0402 (1005M) Capacitor)
pins: 1, 2

## MT15B102K500CT
designator C?  Capacitance: 1nF  (hidden comment: *)
Capacitor, Ceramic (MLCC), 1nF, ±10%, 50V, X7R, ±10%, SMD 0402; Manufacturer: Walsin Tech Corp; Manufacturer Part Number: MT15B102K500CT; Package Size: 0402; JLCPCB Basic Part: No; JLCPCB Part Number: C458947; Supplier 1: LCSC; Category: Capacitors - MLCC; Supplier Part Number 1: C458947; Tolerance: ±10%; Voltage Rating: 50V; Temperature Coefficient: X7R; RoHS: Yes; ComponentLink1Description: Datasheet; ComponentLink1URL: https://wmsc.lcsc.com/wmsc/upload/file/pdf/v2/lcsc/2304140030_Walsin-Tech-Corp-MT15B102K500CT_C458947.pdf; ComponentLink2Description: JLCPCB Part URL; ComponentLink2URL: https://jlcpcb.com/partdetail/C458947; ComponentLink3Description: LCSC Part URL; ComponentLink3URL: https://lcsc.com/product-detail/Multilayer-Ceramic-Capacitors-MLCC---SMD-SMT_Walsin-Tech-Corp-Walsin-Tech-Corp-MT15B102K500CT_C458947.html
footprint CAP-0402 (0402 (1005M) Capacitor)
pins: 1, 2

## MT15B103K250CT
designator C?  Capacitance: 10nF  (hidden comment: *)
Capacitor, Ceramic (MLCC), 10nF, ±10%, 25V, X7R, ±10%, SMD 0402; Manufacturer: Walsin Tech Corp; Manufacturer Part Number: MT15B103K250CT; Package Size: 0402; JLCPCB Basic Part: No; JLCPCB Part Number: C458948; Supplier 1: LCSC; Category: Capacitors - MLCC; Supplier Part Number 1: C458948; Tolerance: ±10%; Voltage Rating: 25V; Temperature Coefficient: X7R; RoHS: Yes; ComponentLink1Description: Datasheet; ComponentLink1URL: https://wmsc.lcsc.com/wmsc/upload/file/pdf/v2/lcsc/2304140030_Walsin-Tech-Corp-MT15B103K250CT_C458948.pdf; ComponentLink2Description: JLCPCB Part URL; ComponentLink2URL: https://jlcpcb.com/partdetail/C458948; ComponentLink3Description: LCSC Part URL; ComponentLink3URL: https://lcsc.com/product-detail/Multilayer-Ceramic-Capacitors-MLCC---SMD-SMT_Walsin-Tech-Corp-Walsin-Tech-Corp-MT15B103K250CT_C458948.html
footprint CAP-0402 (0402 (1005M) Capacitor)
pins: 1, 2

## MT15B103K500CT
designator C?  Capacitance: 10nF  (hidden comment: *)
Capacitor, Ceramic (MLCC), 10nF, ±10%, 50V, X7R, ±10%, SMD 0402; Manufacturer: Walsin Tech Corp; Manufacturer Part Number: MT15B103K500CT; Package Size: 0402; JLCPCB Basic Part: No; JLCPCB Part Number: C323592; Supplier 1: LCSC; Category: Capacitors - MLCC; Supplier Part Number 1: C323592; Tolerance: ±10%; Voltage Rating: 50V; Temperature Coefficient: X7R; RoHS: Yes; ComponentLink1Description: Datasheet; ComponentLink1URL: https://wmsc.lcsc.com/wmsc/upload/file/pdf/v2/lcsc/2304140030_Walsin-Tech-Corp-MT15B103K500CT_C323592.pdf; ComponentLink2Description: JLCPCB Part URL; ComponentLink2URL: https://jlcpcb.com/partdetail/C323592; ComponentLink3Description: LCSC Part URL; ComponentLink3URL: https://lcsc.com/product-detail/Multilayer-Ceramic-Capacitors-MLCC---SMD-SMT_Walsin-Tech-Corp-Walsin-Tech-Corp-MT15B103K500CT_C323592.html
footprint CAP-0402 (0402 (1005M) Capacitor)
pins: 1, 2

## MT15B221K500CT
designator C?  Capacitance: 220pF  (hidden comment: *)
Capacitor, Ceramic (MLCC), 220pF, ±10%, 50V, X7R, ±10%, SMD 0402; Manufacturer: Walsin Tech Corp; Manufacturer Part Number: MT15B221K500CT; Package Size: 0402; JLCPCB Basic Part: No; JLCPCB Part Number: C458950; Supplier 1: LCSC; Category: Capacitors - MLCC; Supplier Part Number 1: C458950; Tolerance: ±10%; Voltage Rating: 50V; Temperature Coefficient: X7R; RoHS: Yes; ComponentLink1Description: Datasheet; ComponentLink1URL: https://wmsc.lcsc.com/wmsc/upload/file/pdf/v2/lcsc/2304140030_Walsin-Tech-Corp-MT15B221K500CT_C458950.pdf; ComponentLink2Description: JLCPCB Part URL; ComponentLink2URL: https://jlcpcb.com/partdetail/C458950; ComponentLink3Description: LCSC Part URL; ComponentLink3URL: https://lcsc.com/product-detail/Multilayer-Ceramic-Capacitors-MLCC---SMD-SMT_Walsin-Tech-Corp-Walsin-Tech-Corp-MT15B221K500CT_C458950.html
footprint CAP-0402 (0402 (1005M) Capacitor)
pins: 1, 2

## MT15B331K500CT
designator C?  Capacitance: 330pF  (hidden comment: *)
Capacitor, Ceramic (MLCC), 330pF, ±10%, 50V, X7R, ±10%, SMD 0402; Manufacturer: Walsin Tech Corp; Manufacturer Part Number: MT15B331K500CT; Package Size: 0402; JLCPCB Basic Part: No; JLCPCB Part Number: C908523; Supplier 1: LCSC; Category: Capacitors - MLCC; Supplier Part Number 1: C908523; Tolerance: ±10%; Voltage Rating: 50V; Temperature Coefficient: X7R; RoHS: Yes; ComponentLink1Description: Datasheet; ComponentLink1URL: https://wmsc.lcsc.com/wmsc/upload/file/pdf/v2/lcsc/2304140030_Walsin-Tech-Corp-MT15B331K500CT_C908523.pdf; ComponentLink2Description: JLCPCB Part URL; ComponentLink2URL: https://jlcpcb.com/partdetail/C908523; ComponentLink3Description: LCSC Part URL; ComponentLink3URL: https://lcsc.com/product-detail/Multilayer-Ceramic-Capacitors-MLCC---SMD-SMT_Walsin-Tech-Corp-Walsin-Tech-Corp-MT15B331K500CT_C908523.html
footprint CAP-0402 (0402 (1005M) Capacitor)
pins: 1, 2

## MT15B332K500CT
designator C?  Capacitance: 3.3nF  (hidden comment: *)
Capacitor, Ceramic (MLCC), 3.3nF, ±10%, 50V, X7R, ±10%, SMD 0402; Manufacturer: Walsin Tech Corp; Manufacturer Part Number: MT15B332K500CT; Package Size: 0402; JLCPCB Basic Part: No; JLCPCB Part Number: C323591; Supplier 1: LCSC; Category: Capacitors - MLCC; Supplier Part Number 1: C323591; Tolerance: ±10%; Voltage Rating: 50V; Temperature Coefficient: X7R; RoHS: Yes; ComponentLink1Description: Datasheet; ComponentLink1URL: https://wmsc.lcsc.com/wmsc/upload/file/pdf/v2/lcsc/2304140030_Walsin-Tech-Corp-MT15B332K500CT_C323591.pdf; ComponentLink2Description: JLCPCB Part URL; ComponentLink2URL: https://jlcpcb.com/partdetail/C323591; ComponentLink3Description: LCSC Part URL; ComponentLink3URL: https://lcsc.com/product-detail/Multilayer-Ceramic-Capacitors-MLCC---SMD-SMT_Walsin-Tech-Corp-Walsin-Tech-Corp-MT15B332K500CT_C323591.html
footprint CAP-0402 (0402 (1005M) Capacitor)
pins: 1, 2

## MT15B471K500CT
designator C?  Capacitance: 470pF  (hidden comment: *)
Capacitor, Ceramic (MLCC), 470pF, ±10%, 50V, X7R, ±10%, SMD 0402; Manufacturer: Walsin Tech Corp; Manufacturer Part Number: MT15B471K500CT; Package Size: 0402; JLCPCB Basic Part: No; JLCPCB Part Number: C458952; Supplier 1: LCSC; Category: Capacitors - MLCC; Supplier Part Number 1: C458952; Tolerance: ±10%; Voltage Rating: 50V; Temperature Coefficient: X7R; RoHS: Yes; ComponentLink1Description: Datasheet; ComponentLink1URL: https://wmsc.lcsc.com/wmsc/upload/file/pdf/v2/lcsc/2304140030_Walsin-Tech-Corp-MT15B471K500CT_C458952.pdf; ComponentLink2Description: JLCPCB Part URL; ComponentLink2URL: https://jlcpcb.com/partdetail/C458952; ComponentLink3Description: LCSC Part URL; ComponentLink3URL: https://lcsc.com/product-detail/Multilayer-Ceramic-Capacitors-MLCC---SMD-SMT_Walsin-Tech-Corp-Walsin-Tech-Corp-MT15B471K500CT_C458952.html
footprint CAP-0402 (0402 (1005M) Capacitor)
pins: 1, 2

## MT15B472K500CT
designator C?  Capacitance: 4.7nF  (hidden comment: *)
Capacitor, Ceramic (MLCC), 4.7nF, ±10%, 50V, X7R, ±10%, SMD 0402; Manufacturer: Walsin Tech Corp; Manufacturer Part Number: MT15B472K500CT; Package Size: 0402; JLCPCB Basic Part: No; JLCPCB Part Number: C458953; Supplier 1: LCSC; Category: Capacitors - MLCC; Supplier Part Number 1: C458953; Tolerance: ±10%; Voltage Rating: 50V; Temperature Coefficient: X7R; RoHS: Yes; ComponentLink1Description: Datasheet; ComponentLink1URL: https://wmsc.lcsc.com/wmsc/upload/file/pdf/v2/lcsc/2304140030_Walsin-Tech-Corp-MT15B472K500CT_C458953.pdf; ComponentLink2Description: JLCPCB Part URL; ComponentLink2URL: https://jlcpcb.com/partdetail/C458953; ComponentLink3Description: LCSC Part URL; ComponentLink3URL: https://lcsc.com/product-detail/Multilayer-Ceramic-Capacitors-MLCC---SMD-SMT_Walsin-Tech-Corp-Walsin-Tech-Corp-MT15B472K500CT_C458953.html
footprint CAP-0402 (0402 (1005M) Capacitor)
pins: 1, 2

## MT15B561K500CT
designator C?  Capacitance: 560pF  (hidden comment: *)
Capacitor, Ceramic (MLCC), 560pF, ±10%, 50V, X7R, ±10%, SMD 0402; Manufacturer: Walsin Tech Corp; Manufacturer Part Number: MT15B561K500CT; Package Size: 0402; JLCPCB Basic Part: No; JLCPCB Part Number: C908544; Supplier 1: LCSC; Category: Capacitors - MLCC; Supplier Part Number 1: C908544; Tolerance: ±10%; Voltage Rating: 50V; Temperature Coefficient: X7R; RoHS: Yes; ComponentLink1Description: Datasheet; ComponentLink1URL: https://wmsc.lcsc.com/wmsc/upload/file/pdf/v2/lcsc/2304140030_Walsin-Tech-Corp-MT15B561K500CT_C908544.pdf; ComponentLink2Description: JLCPCB Part URL; ComponentLink2URL: https://jlcpcb.com/partdetail/C908544; ComponentLink3Description: LCSC Part URL; ComponentLink3URL: https://lcsc.com/product-detail/Multilayer-Ceramic-Capacitors-MLCC---SMD-SMT_Walsin-Tech-Corp-Walsin-Tech-Corp-MT15B561K500CT_C908544.html
footprint CAP-0402 (0402 (1005M) Capacitor)
pins: 1, 2

## MT15B682K500CT
designator C?  Capacitance: 6.8nF  (hidden comment: *)
Capacitor, Ceramic (MLCC), 6.8nF, ±10%, 50V, X7R, ±10%, SMD 0402; Manufacturer: Walsin Tech Corp; Manufacturer Part Number: MT15B682K500CT; Package Size: 0402; JLCPCB Basic Part: No; JLCPCB Part Number: C458954; Supplier 1: LCSC; Category: Capacitors - MLCC; Supplier Part Number 1: C458954; Tolerance: ±10%; Voltage Rating: 50V; Temperature Coefficient: X7R; RoHS: Yes; ComponentLink1Description: Datasheet; ComponentLink1URL: https://wmsc.lcsc.com/wmsc/upload/file/pdf/v2/lcsc/2304140030_Walsin-Tech-Corp-MT15B682K500CT_C458954.pdf; ComponentLink2Description: JLCPCB Part URL; ComponentLink2URL: https://jlcpcb.com/partdetail/C458954; ComponentLink3Description: LCSC Part URL; ComponentLink3URL: https://lcsc.com/product-detail/Multilayer-Ceramic-Capacitors-MLCC---SMD-SMT_Walsin-Tech-Corp-Walsin-Tech-Corp-MT15B682K500CT_C458954.html
footprint CAP-0402 (0402 (1005M) Capacitor)
pins: 1, 2

## MT15B821K500CT
designator C?  Capacitance: 820pF  (hidden comment: *)
Capacitor, Ceramic (MLCC), 820pF, ±10%, 50V, X7R, ±10%, SMD 0402; Manufacturer: Walsin Tech Corp; Manufacturer Part Number: MT15B821K500CT; Package Size: 0402; JLCPCB Basic Part: No; JLCPCB Part Number: C908505; Supplier 1: LCSC; Category: Capacitors - MLCC; Supplier Part Number 1: C908505; Tolerance: ±10%; Voltage Rating: 50V; Temperature Coefficient: X7R; RoHS: Yes; ComponentLink1Description: Datasheet; ComponentLink1URL: https://wmsc.lcsc.com/wmsc/upload/file/pdf/v2/lcsc/2304140030_Walsin-Tech-Corp-MT15B821K500CT_C908505.pdf; ComponentLink2Description: JLCPCB Part URL; ComponentLink2URL: https://jlcpcb.com/partdetail/C908505; ComponentLink3Description: LCSC Part URL; ComponentLink3URL: https://lcsc.com/product-detail/Multilayer-Ceramic-Capacitors-MLCC---SMD-SMT_Walsin-Tech-Corp-Walsin-Tech-Corp-MT15B821K500CT_C908505.html
footprint CAP-0402 (0402 (1005M) Capacitor)
pins: 1, 2